# Altium footprint library Metric_Thru_Hole.PcbLib: 91 footprints (part 3 of 6)
Each footprint in its own frame and in the unit in brackets; x right, y up, seen from the top. Pads: shape width x height; smd on the part's side, far side on the other; paste and mask are expansions set on the pad; w line width, h text height; cw(c..) or ccw(c..) is an arc to the next point about the centre after c.
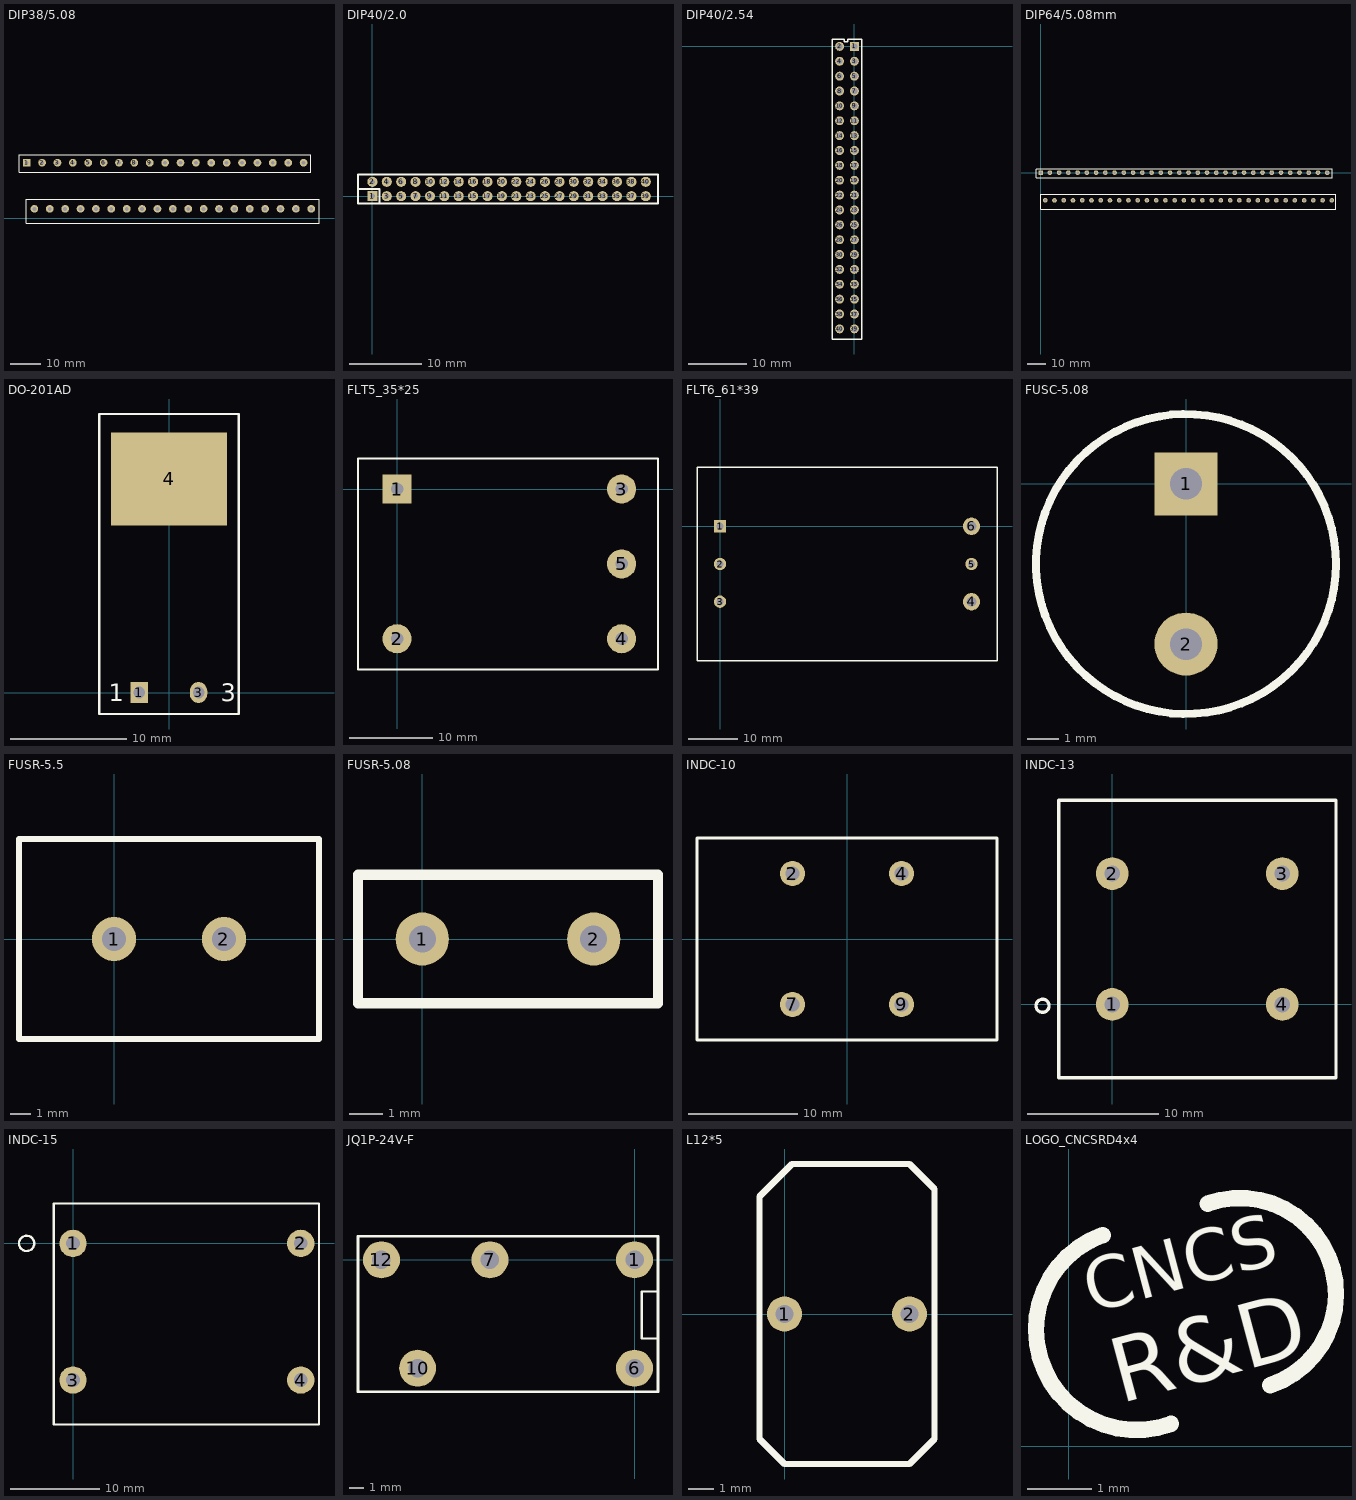
[diagram p2: the footprints below, top view; thin cyan lines are the x and y axes]

## DIP38/5.08 [mil]
pads (38):
  rect 100x100 hole 50: 1(560,725)
  round 100 hole 50: 2(760,725) 3(960,725) 4(1160,725) 5(1360,725) 6(1560,725) 7(1760,725) 8(1960,725) 9(2160,725) 10(2360,725) 11(2560,725) 12(2760,725) 13(2960,725) 14(3160,725) 15(3360,725) 16(3560,725) 17(3760,725) 18(3960,725) 19(4160,725) 20(660,125) 21(860,125) 22(1060,125) 23(1260,125) 24(1460,125) 25(1660,125) 26(1860,125) 27(2060,125) 28(2260,125) 29(2460,125) 30(2660,125) 31(2860,125) 32(3060,125) 33(3260,125) 34(3460,125) 35(3660,125) 36(3860,125) 37(4060,125) 38(4260,125)
Top Overlay:
  lines w12: 4360.39,-63.98 555,-63.98 555,252.07 4360.39,252.07 4360.39,-61.42 ; 460,600.49 4255,600.49 4255,830 460,830 460,600.49
3D body "1725038.stp": height 137.8, standoff -1007.87, extent 440,-41.26 969.17,801.26
3D body "1725038.stp": height 137.8, standoff -1007.87, extent 830.83,-41.26 1360,801.26
3D body "1725041.stp": height 137.8, standoff -1007.87, extent 3590.83,-41.26 4320,801.26
3D body "1725041.stp": height 137.8, standoff -1007.87, extent 3000,-41.26 3729.17,801.26
3D body "1725041.stp": height 137.8, standoff -1007.87, extent 2410.83,-41.26 3140,801.26
3D body "1725041.stp": height 137.8, standoff -1007.87, extent 1815.41,-42.52 2544.59,800
3D body "1725041.stp": height 137.8, standoff -1007.87, extent 1230.83,-41.26 1960,801.26

## DIP40/2.0 [mm] "间距2.0插针,焊盘:外径1.4mm.孔径0.7mm"
height 5
pads (40):
  rect 1.4x1.4 hole 0.7: 1(0,0)
  round 1.4 hole 0.7: 2(0,2) 3(2,0) 4(2,2) 5(4,0) 6(4,2) 7(6,0) 8(6,2) 9(8,0) 10(8,2) 11(10,0) 12(10,2) 13(12,0) 14(12,2) 15(14,0) 16(14,2) 17(16,0) 18(16,2) 19(18,0) 20(18,2) 21(20,0) 22(20,2) 23(22,0) 24(22,2) 25(24,0) 26(24,2) 27(26,0) 28(26,2) 29(28,0) 30(28,2) 31(30,0) 32(30,2) 33(32,0) 34(32,2) 35(34,0) 36(34,2) 37(36,0) 38(36,2) 39(38,0) 40(38,2)
Top Overlay:
  lines w0.254: -2,1 1,1 1,-1 ; -2,-1 -2,3 39.7,3 39.7,-1 -2,-1
3D body: height 5.59, standoff 0.51, extent 37.748,-0.253 38.254,0.253
3D body: height 1.02, standoff 0, extent 36.73,-1.27 39.26,1.265
3D body: height 1.02, standoff 0, extent 36.73,0.762 39.26,3.297
3D body: height 5.59, standoff 0.51, extent 37.748,1.779 38.254,2.285
3D body: height 5.59, standoff 0.51, extent 35.748,-0.253 36.254,0.253
3D body: height 1.02, standoff 0, extent 34.73,-1.27 37.26,1.265
3D body: height 1.02, standoff 0, extent 34.73,0.762 37.26,3.297
3D body: height 5.59, standoff 0.51, extent 35.748,1.779 36.254,2.285
3D body: height 5.59, standoff 0.51, extent 33.748,-0.253 34.254,0.253
3D body: height 1.02, standoff 0, extent 32.73,-1.27 35.26,1.265
3D body: height 1.02, standoff 0, extent 32.73,0.762 35.26,3.297
3D body: height 5.59, standoff 0.51, extent 33.748,1.779 34.254,2.285
3D body: height 5.59, standoff 0.51, extent 31.748,-0.253 32.254,0.253
3D body: height 1.02, standoff 0, extent 30.73,-1.27 33.26,1.265
3D body: height 1.02, standoff 0, extent 30.73,0.762 33.26,3.297
3D body: height 5.59, standoff 0.51, extent 31.748,1.779 32.254,2.285
3D body: height 5.59, standoff 0.51, extent 29.748,-0.253 30.254,0.253
3D body: height 1.02, standoff 0, extent 28.73,-1.27 31.26,1.265
3D body: height 1.02, standoff 0, extent 28.73,0.762 31.26,3.297
3D body: height 5.59, standoff 0.51, extent 29.748,1.779 30.254,2.285
3D body: height 5.59, standoff 0.51, extent 27.748,-0.253 28.254,0.253
3D body: height 1.02, standoff 0, extent 26.73,-1.27 29.26,1.265
3D body: height 1.02, standoff 0, extent 26.73,0.762 29.26,3.297
3D body: height 5.59, standoff 0.51, extent 27.748,1.779 28.254,2.285
3D body: height 5.59, standoff 0.51, extent 25.748,-0.253 26.254,0.253
3D body: height 1.02, standoff 0, extent 24.73,-1.27 27.26,1.265
3D body: height 1.02, standoff 0, extent 24.73,0.762 27.26,3.297
3D body: height 5.59, standoff 0.51, extent 25.748,1.779 26.254,2.285
3D body: height 5.59, standoff 0.51, extent 23.748,-0.253 24.254,0.253
3D body: height 1.02, standoff 0, extent 22.73,-1.27 25.26,1.265
3D body: height 1.02, standoff 0, extent 22.73,0.762 25.26,3.297
3D body: height 5.59, standoff 0.51, extent 23.748,1.779 24.254,2.285
3D body: height 5.59, standoff 0.51, extent 21.748,-0.253 22.254,0.253
3D body: height 1.02, standoff 0, extent 20.73,-1.27 23.26,1.265
3D body: height 1.02, standoff 0, extent 20.73,0.762 23.26,3.297
3D body: height 5.59, standoff 0.51, extent 21.748,1.779 22.254,2.285
3D body: height 5.59, standoff 0.51, extent 19.748,-0.253 20.254,0.253
3D body: height 1.02, standoff 0, extent 18.73,-1.27 21.26,1.265
3D body: height 1.02, standoff 0, extent 18.73,0.762 21.26,3.297
3D body: height 5.59, standoff 0.51, extent 19.748,1.779 20.254,2.285
3D body: height 5.59, standoff 0.51, extent 17.748,-0.253 18.254,0.253
3D body: height 1.02, standoff 0, extent 16.73,-1.27 19.26,1.265
3D body: height 1.02, standoff 0, extent 16.73,0.762 19.26,3.297
3D body: height 5.59, standoff 0.51, extent 17.748,1.779 18.254,2.285
3D body: height 5.59, standoff 0.51, extent 15.748,-0.253 16.254,0.253
3D body: height 1.02, standoff 0, extent 14.73,-1.27 17.26,1.265
3D body: height 1.02, standoff 0, extent 14.73,0.762 17.26,3.297
3D body: height 5.59, standoff 0.51, extent 15.748,1.779 16.254,2.285
3D body: height 5.59, standoff 0.51, extent 13.748,-0.253 14.254,0.253
3D body: height 1.02, standoff 0, extent 12.73,-1.27 15.26,1.265
3D body: height 1.02, standoff 0, extent 12.73,0.762 15.26,3.297
3D body: height 5.59, standoff 0.51, extent 13.748,1.779 14.254,2.285
3D body: height 5.59, standoff 0.51, extent 11.748,-0.253 12.254,0.253
3D body: height 1.02, standoff 0, extent 10.73,-1.27 13.26,1.265
3D body: height 1.02, standoff 0, extent 10.73,0.762 13.26,3.297
3D body: height 5.59, standoff 0.51, extent 11.748,1.779 12.254,2.285
3D body: height 5.59, standoff 0.51, extent 9.748,-0.253 10.254,0.253
3D body: height 1.02, standoff 0, extent 8.73,-1.27 11.26,1.265
3D body: height 1.02, standoff 0, extent 8.73,0.762 11.26,3.297
3D body: height 5.59, standoff 0.51, extent 9.748,1.779 10.254,2.285
3D body: height 5.59, standoff 0.51, extent 7.748,-0.253 8.254,0.253
3D body: height 1.02, standoff 0, extent 6.73,-1.27 9.26,1.265
3D body: height 1.02, standoff 0, extent 6.73,0.762 9.26,3.297
3D body: height 5.59, standoff 0.51, extent 7.748,1.779 8.254,2.285
3D body: height 5.59, standoff 0.51, extent 5.748,-0.253 6.254,0.253
3D body: height 1.02, standoff 0, extent 4.73,-1.27 7.26,1.265
3D body: height 1.02, standoff 0, extent 4.73,0.762 7.26,3.297
3D body: height 5.59, standoff 0.51, extent 5.748,1.779 6.254,2.285
3D body: height 5.59, standoff 0.51, extent 3.748,-0.253 4.254,0.253
3D body: height 1.02, standoff 0, extent 2.73,-1.27 5.26,1.265
3D body: height 1.02, standoff 0, extent 2.73,0.762 5.26,3.297
3D body: height 5.59, standoff 0.51, extent 3.748,1.779 4.254,2.285
3D body: height 5.59, standoff 0.51, extent 1.748,-0.253 2.254,0.253
3D body: height 1.02, standoff 0, extent 0.73,-1.27 3.26,1.265
3D body: height 1.02, standoff 0, extent 0.73,0.762 3.26,3.297
3D body: height 5.59, standoff 0.51, extent 1.748,1.779 2.254,2.285
3D body: height 5.59, standoff 0.51, extent -0.252,-0.253 0.254,0.253
3D body: height 1.02, standoff 0, extent -1.27,-1.27 1.26,1.265
3D body: height 1.02, standoff 0, extent -1.27,0.762 1.26,3.297
3D body: height 5.59, standoff 0.51, extent -0.252,1.779 0.254,2.285

## DIP40/2.54 [mil]
pads (40):
  rect 60x60 / inner round 60 / far side rect 60x60 hole 39.37: 1(0,0)
  round 60 hole 39.37: 2(-100,0) 3(0,-100) 4(-100,-100) 5(0,-200) 6(-100,-200) 7(0,-300) 8(-100,-300) 9(0,-400) 10(-100,-400) 11(0,-500) 12(-100,-500) 13(0,-600) 14(-100,-600) 15(0,-700) 16(-100,-700) 17(0,-800) 18(-100,-800) 19(0,-900) 20(-100,-900) 21(0,-1000) 22(-100,-1000) 23(0,-1100) 24(-100,-1100) 25(0,-1200) 26(-100,-1200) 27(0,-1300) 28(-100,-1300) 29(0,-1400) 30(-100,-1400) 31(0,-1500) 32(-100,-1500) 33(0,-1600) 34(-100,-1600) 35(0,-1700) 36(-100,-1700) 37(0,-1800) 38(-100,-1800) 39(0,-1900) 40(-100,-1900)
Top Overlay:
  lines w10: -150,-1968 -150,50 -68.75,50 -68.75,31 -43.31,31 -43.31,50 50,50 50,-1968 -150,-1968

## DIP64/5.08mm [mm]
pads (64):
  rect 2.54x2.54 hole 1.27: 1(0,0)
  round 2.54 hole 1.27: 2(5.08,0) 3(10.16,0) 4(15.24,0) 5(20.32,0) 6(25.4,0) 7(30.48,0) 8(35.56,0) 9(40.64,0) 10(45.72,0) 11(50.8,0) 12(55.88,0) 13(60.96,0) 14(66.04,0) 15(71.12,0) 16(76.2,0) 17(81.28,0) 18(86.36,0) 19(91.44,0) 20(96.52,0) 21(101.6,0) 22(106.68,0) 23(111.76,0) 24(116.84,0) 25(121.92,0) 26(127,0) 27(132.08,0) 28(137.16,0) 29(142.24,0) 30(147.32,0) 31(152.4,0) 32(157.48,0) 33(2.54,-15.24) 34(7.62,-15.24) 35(12.7,-15.24) 36(17.78,-15.24) 37(22.86,-15.24) 38(27.94,-15.24) 39(33.02,-15.24) 40(38.1,-15.24) 41(43.18,-15.24) 42(48.26,-15.24) 43(53.34,-15.24) 44(58.42,-15.24) 45(63.5,-15.24) 46(68.58,-15.24) 47(73.66,-15.24) 48(78.74,-15.24) 49(83.82,-15.24) 50(88.9,-15.24) 51(93.98,-15.24) 52(99.06,-15.24) 53(104.14,-15.24) 54(109.22,-15.24) 55(114.3,-15.24) 56(119.38,-15.24) 57(124.46,-15.24) 58(129.54,-15.24) 59(134.62,-15.24) 60(139.7,-15.24) 61(144.78,-15.24) 62(149.86,-15.24) 63(154.94,-15.24) 64(160.02,-15.24)
Top Overlay:
  lines w0.305: -2.54,-2.807 160.147,-2.807 160.147,2.019 -2.54,2.019 ; -2.54,-2.705 -2.54,1.917 ; 0.127,-20.04 0.127,-12.012 162.306,-12.012 162.306,-20.04 0.127,-20.04
3D body "1725041.stp": height 3.5, standoff -25.6, extent 6.996,-19.368 25.516,2.032
3D body "1725041.stp": height 3.5, standoff -25.6, extent 22.236,-19.368 40.756,2.032
3D body "1725041.stp": height 3.5, standoff -25.6, extent 37.476,-19.368 55.996,2.032
3D body "1725041.stp": height 3.5, standoff -25.6, extent 52.599,-19.336 71.12,2.064
3D body "1725041.stp": height 3.5, standoff -25.6, extent 67.839,-19.336 86.36,2.064
3D body "1725041.stp": height 3.5, standoff -25.6, extent 83.079,-19.336 101.6,2.064
3D body "1725041.stp": height 3.5, standoff -25.6, extent 97.928,-19.368 116.448,2.032
3D body "1725041.stp": height 3.5, standoff -25.6, extent 113.051,-19.336 131.572,2.064
3D body "1725041.stp": height 3.5, standoff -25.6, extent 128.016,-19.336 146.537,2.064
3D body "1725041.stp": height 3.5, standoff -25.6, extent 143.023,-19.336 161.544,2.064
3D body "1725038.stp": height 3.5, standoff -25.6, extent -3.048,-19.336 10.393,2.064

## DO-201AD [mm] "TO, Thru-Hole, Vertical, Heatsink Mounted; 5 In-Line Leads; Pitch 1.70 mm"
height 15.1
pads (3):
  rect 1.5x1.8 hole 1: 1(-2.55,0)
  oval 1.5x1.8 hole 1: 3(2.55,0)
  rect 10x8 smd mask+0.75: 4(0,18.415)
Top Overlay:
  lines w0.2: -6,24.003 -6,20.924 -6,2.85 -6,-1.85 -4.445,-1.85 4.572,-1.85 6,-1.85 6,2.85 6,20.859 6,23.972 ; -5.904,24.003 -2.921,24.003 5.969,24.003
  text "3" at 4.445,-0.762 h1.5
  text "1" at -5.207,-0.762 h1.5

## FLT5_35*25 [mm]
pads (5):
  rect 3.5x3.5 hole 1.5: 1(0,0)
  round 3.5 hole 1.5: 2(0,-18) 3(27,0) 4(27,-18) 5(27,-9)
Top Overlay:
  lines w0.254: -4.699,-21.717 -4.699,3.683 31.369,3.683 31.369,-21.717 -4.699,-21.717
3D body: height 0.34, standoff 0, extent -4.572,-21.59 31.242,3.556

## FLT6_61*39 [mm]
height 13.33
pads (6):
  rect 2.5x2.5 hole 1.5: 1(0,0)
  round 2.5 hole 1.5: 2(0,-7.62) 3(0,-15.24) 5(50.8,-7.62)
  round 3.5 hole 2: 4(50.8,-15.24) 6(50.8,0)
Top Overlay:
  lines w0.254: -4.65,-27.125 55.95,-27.125 55.95,11.885 -4.65,11.885 -4.65,-27.125
Bottom Overlay:
  text "4" at 46.404,-15.796 h1.02
  text "5" at 46.404,-8.049 h1.02
  text "6" at 46.404,-0.429 h1.02
  text "3" at 4.24,-15.796 h1.02
  text "2" at 4.24,-8.049 h1.02
  text "1" at 4.367,-0.556 h1.02
3D body: height 12.7, standoff 0.1, extent -4.65,-27.226 56.056,11.89

## FUSC-5.08 [mm] "Holder for MSx 250"
height 4.4
pads (2):
  rect 2x2 hole 1: 1(0,0)
  round 2 hole 1: 2(0,-5.08)
Top Overlay:
  circle w0.254: c0,-2.54 r4.759
3D body "User Library-Fu¡sivel 37200500411.STEP": height 8, standoff -4.3, extent -4.25,-6.976 4.25,1.524

## FUSR-5.5 [mm] "14*9*25mm,管脚间距5.5mm"
height 25
pads (2):
  round 2.2 hole 1.2: 1(0,0) 2(5.5,0)
Top Overlay:
  lines w0.305: -4.75,-5 10.25,-5 10.25,5 -4.75,5 -4.75,-5
3D body "User Library-PTC.STEP": height 14.5, standoff -3.72, extent -0.95,-0.889 6.45,0.811

## FUSR-5.08 [mil] "250-080u保险丝使用"
height 366.14
pads (2):
  round 62 hole 31.5: 1(0,0) 2(200,0)
Top Overlay:
  lines w12: -75,-75 -75,75 275,75 275,-75 -75,-75
3D body "User Library-PTC.STEP": height 570.87, standoff -146.47, extent -31.34,-26.93 260,40

## INDC-10 [mm]
height 33
pads (4):
  round 2.3 hole 1.3: 2(-5,6) 4(5,6) 7(-5,-6) 9(5,-6)
Top Overlay:
  lines w0.254: -13.75,-9.25 -13.75,9.25 13.75,9.25 13.75,-9.25 -13.75,-9.25

## INDC-13 [mm] "Body 21.2*21.2mm"
height 17.8
pads (4):
  round 2.5 hole 1.2: 1(0,0) 2(0,10) 3(13,10) 4(13,0)
Top Overlay:
  circle w0.254: c-5.328,-0.105 r0.5
  lines w0.254: -4.1,-5.6 17.1,-5.6 17.1,15.6 -4.1,15.6 -4.1,-5.6
3D body: height 20.45, standoff 0, extent -4.1,-5.6 17.1,15.6

## INDC-15 [mil]
height 805
pads (4):
  round 120 hole 60: 1(0,0) 2(1000,0) 3(0,-600) 4(1000,-600)
Top Overlay:
  circle w10: c-203.54,0 r33.54
  lines w10: -85,-795 1080,-795 1080,175 ; -85,-790 -85,175 1075,175
3D body: height 805, standoff 0, extent -80,-780 1080,160

## JQ1P-24V-F [mm] "松下继电器JQ1P-24V-F专用封装"
pads (5):
  round 2.6 hole 1.3: 1(0,0) 6(0,-7.62) 7(-10.16,0) 10(-15.24,-7.62) 12(-17.78,0)
Top Overlay:
  lines w0.15: 1.549,-2.235 0.508,-2.235 ; 1.575,-5.537 0.508,-5.537 ; 0.508,-5.537 0.508,-2.235 ; 0.508,-5.537 0.508,-2.235
  lines w0.203: -19.431,-9.271 -19.431,1.651 1.651,1.651 1.651,-9.271 -19.431,-9.271
3D body "User Library-HF33F.STEP": height 15.65, standoff -3.65, extent -19.394,-9.144 1.106,1.056

## L12*5 [mm] "L12x5扼流圈(通孔型),磁环直径12mmx厚5mm"
height 13
pads (2):
  round 1.4 hole 0.7: 1(0,0) 2(5,0)
Top Overlay:
  lines w0.254: -1,-5 0,-6 5,-6 6,-5 6,5 5,6 0.3,6 -1,4.7 -1,0 -1,-5

## LOGO_CNCSRD4x4 [mm] "CNCS 研发部 公司标志 4mm x 4mm"
Top Overlay:
  lines w0.254: 0.528,3.263 ccw(c1.05,1.8) 1.585,0.342 ; 2.15,3.75 cw(c2.65,2.35) 3.12,0.94
  text "CNCS" at 0.35,2.05 h0.8
  text "R&D" at 0.8,0.65 h1